# Altium footprint library E17-04-PCB1.PcbLib: 39 footprints (part 1 of 3)
Each footprint in its own frame and in the unit in brackets; x right, y up, seen from the top. Pads: shape width x height; smd on the part's side, far side on the other; paste and mask are expansions set on the pad; w line width, h text height; cw(c..) or ccw(c..) is an arc to the next point about the centre after c.
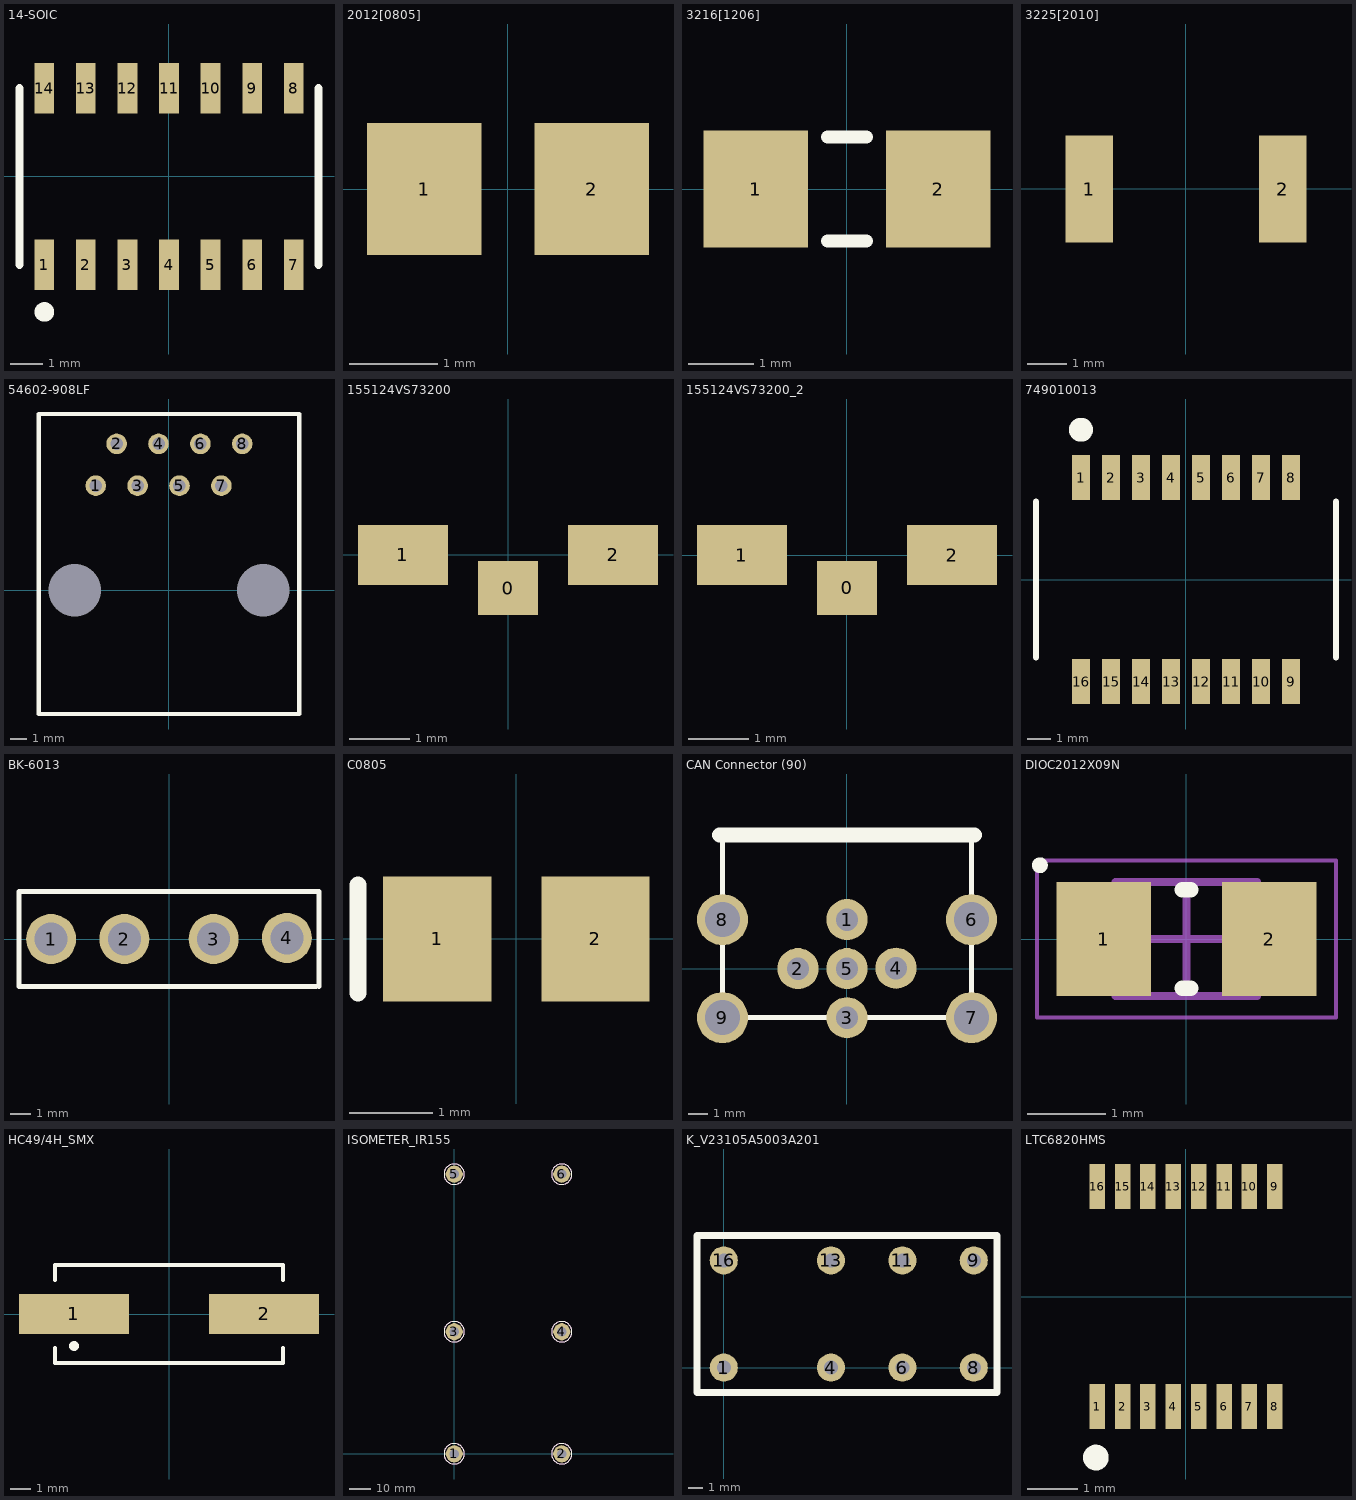
[diagram p0: the footprints below, top view; thin cyan lines are the x and y axes]

## 14-SOIC [mm]
pads (14):
  rect 0.6x1.55 smd: 1(-3.81,-2.7) 2(-2.54,-2.7) 3(-1.27,-2.7) 4(0,-2.7) 5(1.27,-2.7) 6(2.54,-2.7) 7(3.81,-2.7) 8(3.81,2.7) 9(2.54,2.7) 10(1.27,2.7) 11(0,2.7) 12(-1.27,2.7) 13(-2.54,2.7) 14(-3.81,2.7)
Top Overlay:
  circle w0.4: c-3.81,-4.14 r0.1
  lines w0.254: -4.572,-2.7 -4.572,2.7 ; 4.572,-2.7 4.572,2.7
3D body "SOIC14 narrow.stp": height 1.95, standoff -0.05, extent -4.405,-3.082 4.405,3.082

## 2012[0805] [mm] "Chip Resistor; Body 2.0 x 1.3 mm (LxW typ)"
height 2.54
pads (2):
  rect 1.3x1.5 smd: 1(-0.95,0) 2(0.95,0)
3D body "SW3dPS-0805 SMD Resistor.STEP": height 0.77, standoff -0.01, extent -0.975,-0.61 1.025,0.64

## 3216[1206] [mm] "Chip Resistor; Body 3.2 x 1.6 mm (LxW typ)"
height 2.54
pads (2):
  rect 1.6x1.8 smd: 1(-1.4,0) 2(1.4,0)
Top Overlay:
  lines w0.2: -0.3,-0.8 0.3,-0.8 ; -0.3,0.8 0.3,0.8
3D body "SW3dPS-1206 SMD Resistor.STEP": height 1, standoff -0.01, extent -1.6,-0.787 1.6,0.813

## 3225[2010] [mm] "Chip Resistor; Body 5.0 x 2.5 mm (LxW typ)"
height 2.54
pads (2):
  rect 1.2x2.7 smd: 1(-2.45,0) 2(2.45,0)
3D body "RES2010.stp": height 0.55, standoff 0, extent -2.45,-1.2 2.45,1.2

## 54602-908LF [mm] "CONN MOD JACK R/A 8P8C"
pads (10):
  round 0 hole 3.2: 0(-5.715,0) 0(5.715,0)
  round 1.25 hole 0.76: 1(-4.445,6.35) 2(-3.175,8.89) 3(-1.905,6.35) 4(-0.635,8.89) 5(0.635,6.35) 6(1.905,8.89) 7(3.175,6.35) 8(4.445,8.89)
Top Overlay:
  lines w0.254: -7.9,-7.5 7.9,-7.5 7.9,10.7 -7.9,10.7 -7.9,-7.5
3D body "54602-908LF.STEP": height 12.7, standoff -3.25, extent -7.65,-7.244 7.65,10.496

## 155124VS73200 [mm] "LED Right Angle Green"
pads (3):
  rect 1x0.9 smd: 0(0,-0.55)
  rect 1.5x1 smd: 1(-1.75,0) 2(1.75,0)
3D body "WL-SMSW_1204.stp": height 1.01, standoff 0.01, extent -1.6,-0.254 1.6,1.231

## 155124VS73200_2 [mm]
pads (3):
  rect 1x0.9 smd: 0(0,-0.55)
  rect 1.5x1 smd: 1(-1.75,0) 2(1.75,0)
3D body "WL-SMSW_1204.stp": height 1.01, standoff 0.01, extent -1.6,-0.254 1.6,1.231

## 749010013 [mil] "TRANSFORMER LAN 10/100 SMD"
height 210
pads (16):
  rect 30x75 smd: 1(-175,170) 2(-125,170) 3(-75,170) 4(-25,170) 5(25,170) 6(75,170) 7(125,170) 8(175,170) 9(175,-170) 10(125,-170) 11(75,-170) 12(25,-170) 13(-25,-170) 14(-75,-170) 15(-125,-170) 16(-175,-170)
Top Overlay:
  circle w20: c-175,250 r10
  lines w10: -250,-130 -250,130 ; 250,-130 250,130
3D body "749010013.STEP": height 209.84, standoff -1.57, extent -254.92,-185.04 254.92,185.04

## BK-6013 [mm] "FUSE HOLDER BLADE PCB"
height 5
pads (4):
  round 2.5 hole 1.65: 1(-5.895,0) 2(-2.235,0) 3(2.235,0) 4(5.895,0.051)
Top Overlay:
  lines w0.254: -7.5,-2.375 -7.5,2.375 ; -7.442,-2.375 7.35,-2.375 ; -7.442,2.375 7.5,2.375 7.5,-2.375

## C0805 [mm] "Chip Capacitor; Body 2.0 x 1.2 mm (LxW typ)"
height 1.1
pads (2):
  rect 1.3x1.5 smd: 1(-0.95,0) 2(0.95,0)
Top Overlay:
  lines w0.2: -1.9,-0.65 -1.9,0.65

## CAN Connector (90) [mm] "90 Degree Configuration"
pads (9):
  round 2.1 hole 1.14: 1(0,2.5) 2(-2.5,0) 3(0,-2.5) 4(2.5,0.025) 5(0,0)
  round 2.6 hole 1.78: 6(6.35,2.5) 7(6.35,-2.5) 8(-6.35,2.5) 9(-6.35,-2.5)
Top Overlay:
  lines w0.254: -6.35,6.825 -6.35,-2.5 6.35,-2.5 6.35,6.825
  lines w0.763: -6.5,6.825 6.5,6.825
3D body "Micro-Change® (M12) PCB Mounting Receptacle, 5 Poles, Male, Straight.SLDPRT": height 18.55, standoff -3.99, extent -10.283,-7.25 10.284,21.246

## DIOC2012X09N [mm] "Chip Diode, 2-Leads, Body 2.00x1.25mm, IPC Medium Density"
height 0.95
pads (2):
  rect 1.2x1.45 smd: 1(-1.05,0) 2(1.05,0)
Top Overlay:
  circle w0.1: c-1.862,0.937 r0.05
  lines w0.2: -0.05,-0.625 0.05,-0.625 ; -0.05,0.625 0.05,0.625
Mechanical 13:
  lines w0.1: -0.9,-0.725 0.9,-0.725 0.9,0.725 -0.9,0.725 -0.9,-0.725
Mechanical 15:
  lines w0.05: -1.9,-1 1.9,-1 1.9,1 -1.9,1 -1.9,-1
  lines w0.1: -0.5,0 0.5,0 ; 0,-0.5 0,0.5
3D body "DIOC2012X09N.step": height 0.95, standoff 0, extent -0.9,-0.725 0.9,0.725

## HC49/4H_SMX [mm] "Quartz Crystal, SM; Body 13.4 (inc. leads) x 4.9 mm (LxW max)"
height 4.3
pads (2):
  rect 5.5x2 smd: 1(-4.75,0) 2(4.75,0)
Top Overlay:
  circle w0.25: c-4.75,-1.6 r0.125
  lines w0.2: -5.7,-1.7 -5.7,-2.45 5.7,-2.45 5.7,-1.7 ; -5.7,1.7 -5.7,2.45 5.7,2.45 5.7,1.7
3D body "ABLS2.STEP": height 3.16, standoff -0.1, extent -6.35,-2.349 6.35,2.35

## ISOMETER_IR155 [mm] "The ISOMETER® iso-F1 IR155-3203/-3204 monitors the insulation resistance between the insulated and active HV-conductors of an electrical drive system (Un = DC 0 V…1000 V) and the reference earth (chassis ground &gt; Kl.31)."
pads (6):
  round 8 hole 4.2: 1(0,0) 2(50,0) 3(0,56.75) 4(50,56.75) 5(0,130) 6(50,130)
Top Overlay keep-out:
  circle w0.254: c50,130 r4.75
  circle w0.254: c50,56.75 r4.75
  circle w0.254: c50,0 r4.75
  circle w0.254: c0,130 r4.75
  circle w0.254: c0,56.75 r4.75
  circle w0.254: c0,0 r4.75
3D body "IMD_MAIN_TEST.SLDPRT": height 24.2, standoff 0, extent -4.999,-6.1 56.101,134.998

## K_V23105A5003A201 [mm]
pads (8):
  round 2 hole 1: 1(0,0) 4(7.62,0) 6(12.7,0) 8(17.78,0) 9(17.78,7.62) 11(12.7,7.62) 13(7.62,7.62) 16(0,7.62)
Top Overlay:
  lines w0.508: -1.905,-1.778 -1.905,-1.27 -1.905,9.398 19.431,9.398 19.431,-1.778 -1.905,-1.778
3D body "RELAY8-398X799_451.stp": height 11.46, standoff -2.54, extent -1.422,-1.244 18.872,8.865

## LTC6820HMS [mm] "MSOP-16"
pads (16):
  rect 0.305x0.889 smd: 1(-1.75,-2.171) 2(-1.25,-2.171) 3(-0.75,-2.171) 4(-0.25,-2.171) 5(0.25,-2.171) 6(0.75,-2.171) 7(1.25,-2.171) 8(1.75,-2.171) 9(1.75,2.171) 10(1.25,2.171) 11(0.75,2.171) 12(0.25,2.171) 13(-0.25,2.171) 14(-0.75,2.171) 15(-1.25,2.171) 16(-1.75,2.171)
Top Overlay:
  circle w0.254: c-1.778,-3.175 r0.127
3D body "MSOP-16.STEP": height 0.83, standoff -0.03, extent -2.019,-2.45 2.02,2.45